# Altium footprint library Connector_Samtec_HLE_SMD.PcbLib: 290 footprints (part 14 of 24)
Each footprint in its own frame and in the unit in brackets; x right, y up, seen from the top. Pads: shape width x height; smd on the part's side, far side on the other; paste and mask are expansions set on the pad; w line width, h text height; cw(c..) or ccw(c..) is an arc to the next point about the centre after c.
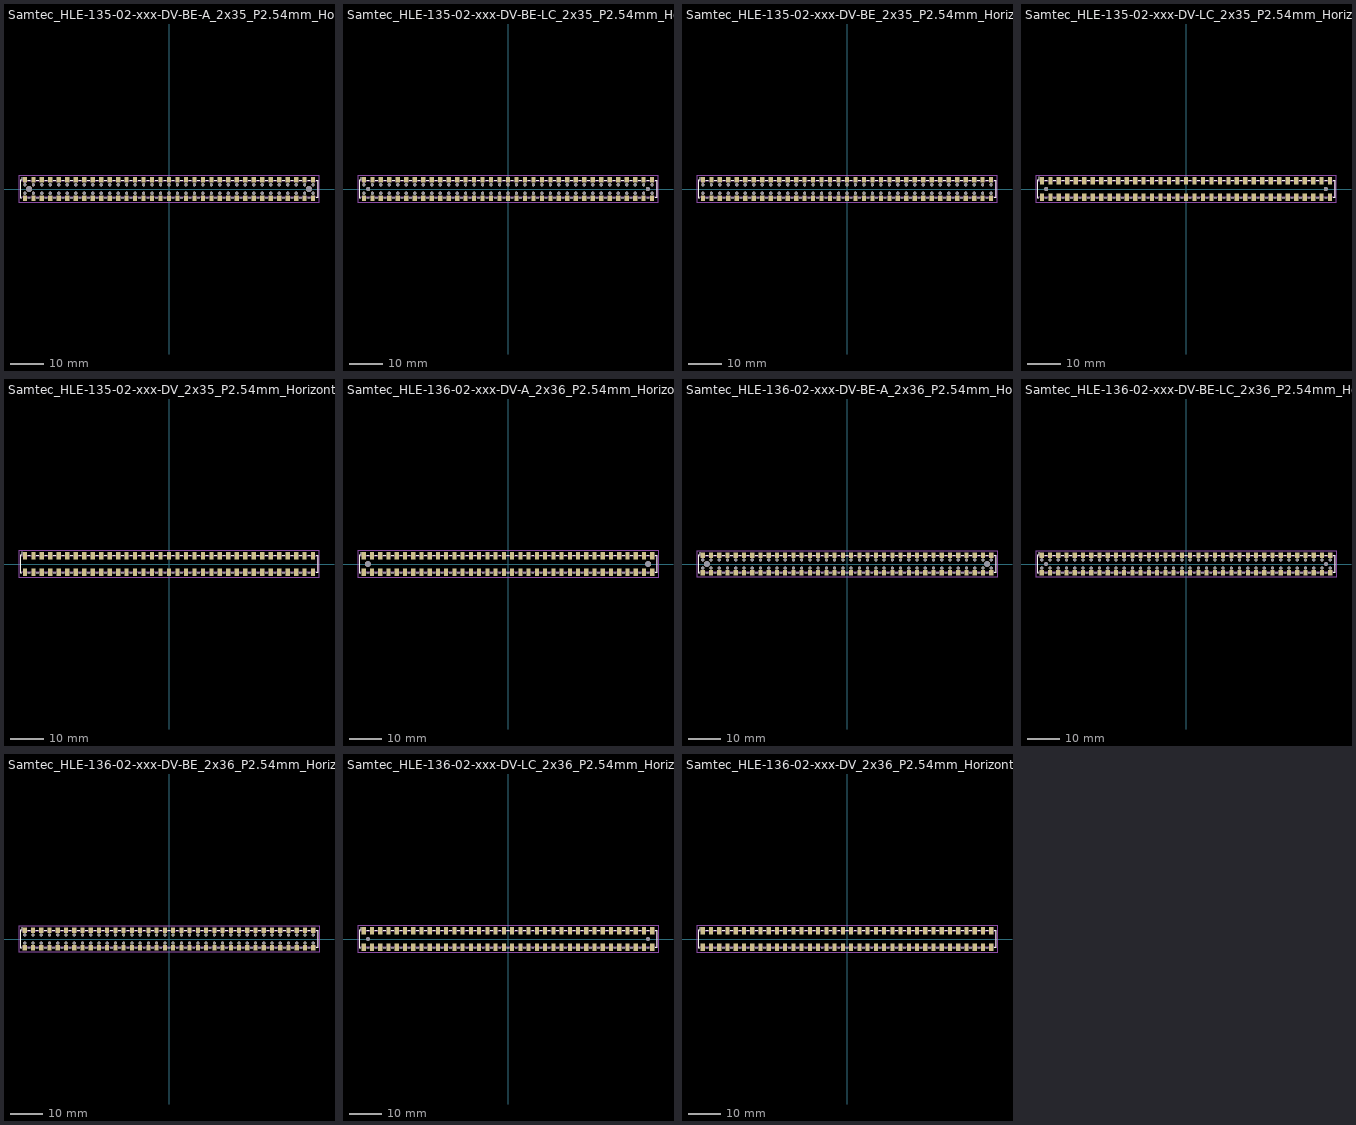
[diagram p13: the footprints below, top view; thin cyan lines are the x and y axes]

## Samtec_HLE-135-02-xxx-DV-BE-A_2x35_P2.54mm_Horizontal [mm]
pads (142):
  rect 1.27x1.68 smd: 1(-43.18,2.72) 2(-43.18,-2.72) 3(-40.64,2.72) 4(-40.64,-2.72) 5(-38.1,2.72) 6(-38.1,-2.72) 7(-35.56,2.72) 8(-35.56,-2.72) 9(-33.02,2.72) 10(-33.02,-2.72) 11(-30.48,2.72) 12(-30.48,-2.72) 13(-27.94,2.72) 14(-27.94,-2.72) 15(-25.4,2.72) 16(-25.4,-2.72) 17(-22.86,2.72) 18(-22.86,-2.72) 19(-20.32,2.72) 20(-20.32,-2.72) 21(-17.78,2.72) 22(-17.78,-2.72) 23(-15.24,2.72) 24(-15.24,-2.72) 25(-12.7,2.72) 26(-12.7,-2.72) 27(-10.16,2.72) 28(-10.16,-2.72) 29(-7.62,2.72) 30(-7.62,-2.72) 31(-5.08,2.72) 32(-5.08,-2.72) 33(-2.54,2.72) 34(-2.54,-2.72) 35(0,2.72) 36(0,-2.72) 37(2.54,2.72) 38(2.54,-2.72) 39(5.08,2.72) 40(5.08,-2.72) 41(7.62,2.72) 42(7.62,-2.72) 43(10.16,2.72) 44(10.16,-2.72) 45(12.7,2.72) 46(12.7,-2.72) 47(15.24,2.72) 48(15.24,-2.72) 49(17.78,2.72) 50(17.78,-2.72) 51(20.32,2.72) 52(20.32,-2.72) 53(22.86,2.72) 54(22.86,-2.72) 55(25.4,2.72) 56(25.4,-2.72) 57(27.94,2.72) 58(27.94,-2.72) 59(30.48,2.72) 60(30.48,-2.72) 61(33.02,2.72) 62(33.02,-2.72) 63(35.56,2.72) 64(35.56,-2.72) 65(38.1,2.72) 66(38.1,-2.72) 67(40.64,2.72) 68(40.64,-2.72) 69(43.18,2.72) 70(43.18,-2.72)
  round 0.97 hole 0.97: Un1(5.08,1.27) Un2(-38.1,1.27) Un3(30.48,1.27) Un4(12.7,1.27) Un5(-15.24,-1.27) Un6(0,-1.27) Un7(22.86,-1.27) Un8(-20.32,1.27) Un9(38.1,1.27) Un10(22.86,1.27) Un11(-27.94,-1.27) Un12(-25.4,1.27) Un13(25.4,1.27) Un14(27.94,-1.27) Un15(-17.78,1.27) Un16(-7.62,1.27) Un17(-35.56,-1.27) Un18(20.32,1.27) Un19(-20.32,-1.27) Un20(-40.64,1.27) Un21(-15.24,1.27) Un22(12.7,-1.27) Un24(25.4,-1.27) Un26(-5.08,1.27) Un27(-10.16,-1.27) Un28(-12.7,1.27) Un29(-30.48,1.27) Un30(33.02,-1.27) Un31(10.16,-1.27) Un32(0,1.27) Un33(5.08,-1.27) Un34(-12.7,-1.27) Un35(-33.02,1.27) Un36(-40.64,-1.27) Un37(-43.18,-1.27) Un38(-22.86,1.27) Un39(17.78,-1.27) Un40(35.56,-1.27) Un41(7.62,1.27) Un42(40.64,1.27) Un43(40.64,-1.27) Un44(-7.62,-1.27) Un45(2.54,1.27) Un46(35.56,1.27) Un47(43.18,1.27) Un48(38.1,-1.27) Un49(-5.08,-1.27) Un50(-10.16,1.27) Un51(20.32,-1.27) Un52(-2.54,-1.27) Un53(-38.1,-1.27) Un54(33.02,1.27) Un55(-27.94,1.27) Un56(30.48,-1.27) Un57(43.18,-1.27) Un58(17.78,1.27) Un59(-35.56,1.27) Un60(-25.4,-1.27) Un61(15.24,-1.27) Un62(27.94,1.27) Un63(-2.54,1.27) Un64(15.24,1.27) Un65(7.62,-1.27) Un66(-43.18,1.27) Un67(-33.02,-1.27) Un68(-22.86,-1.27) Un69(-17.78,-1.27) Un70(2.54,-1.27) Un71(10.16,1.27) Un72(-30.48,-1.27)
  round 1.78 hole 1.78: Un23(-41.91,0) Un25(41.91,0)
F.SilkS:
  lines w0.12: -44.075,-2.65 -44.56,-2.65 -44.56,2.65 -44.075,2.65 -44.075,3.56 ; -42.285,-2.65 -41.535,-2.65 ; -42.285,2.65 -41.535,2.65 ; -39.745,-2.65 -38.995,-2.65 ; -39.745,2.65 -38.995,2.65 ; -37.205,-2.65 -36.455,-2.65 ; -37.205,2.65 -36.455,2.65 ; -34.665,-2.65 -33.915,-2.65 ; -34.665,2.65 -33.915,2.65 ; -32.125,-2.65 -31.375,-2.65 ; -32.125,2.65 -31.375,2.65 ; -29.585,-2.65 -28.835,-2.65 ; -29.585,2.65 -28.835,2.65 ; -27.045,-2.65 -26.295,-2.65 ; -27.045,2.65 -26.295,2.65 ; -24.505,-2.65 -23.755,-2.65 ; -24.505,2.65 -23.755,2.65 ; -21.965,-2.65 -21.215,-2.65 ; -21.965,2.65 -21.215,2.65 ; -19.425,-2.65 -18.675,-2.65 ; -19.425,2.65 -18.675,2.65 ; -16.885,-2.65 -16.135,-2.65 ; -16.885,2.65 -16.135,2.65 ; -14.345,-2.65 -13.595,-2.65 ; -14.345,2.65 -13.595,2.65 ; -11.805,-2.65 -11.055,-2.65 ; -11.805,2.65 -11.055,2.65 ; -9.265,-2.65 -8.515,-2.65 ; -9.265,2.65 -8.515,2.65 ; -6.725,-2.65 -5.975,-2.65 ; -6.725,2.65 -5.975,2.65 ; -4.185,-2.65 -3.435,-2.65 ; -4.185,2.65 -3.435,2.65 ; -1.645,-2.65 -0.895,-2.65 ; -1.645,2.65 -0.895,2.65 ; 0.895,-2.65 1.645,-2.65 ; 0.895,2.65 1.645,2.65 ; 3.435,-2.65 4.185,-2.65 ; 3.435,2.65 4.185,2.65 ; 5.975,-2.65 6.725,-2.65 ; 5.975,2.65 6.725,2.65 ; 8.515,-2.65 9.265,-2.65 ; 8.515,2.65 9.265,2.65 ; 11.055,-2.65 11.805,-2.65 ; 11.055,2.65 11.805,2.65 ; 13.595,-2.65 14.345,-2.65 ; 13.595,2.65 14.345,2.65 ; 16.135,-2.65 16.885,-2.65 ; 16.135,2.65 16.885,2.65 ; 18.675,-2.65 19.425,-2.65 ; 18.675,2.65 19.425,2.65 ; 21.215,-2.65 21.965,-2.65 ; 21.215,2.65 21.965,2.65 ; 23.755,-2.65 24.505,-2.65 ; 23.755,2.65 24.505,2.65 ; 26.295,-2.65 27.045,-2.65 ; 26.295,2.65 27.045,2.65 ; 28.835,-2.65 29.585,-2.65 ; 28.835,2.65 29.585,2.65 ; 31.375,-2.65 32.125,-2.65 ; 31.375,2.65 32.125,2.65 ; 33.915,-2.65 34.665,-2.65 ; 33.915,2.65 34.665,2.65 ; 36.455,-2.65 37.205,-2.65 ; 36.455,2.65 37.205,2.65 ; 38.995,-2.65 39.745,-2.65 ; 38.995,2.65 39.745,2.65 ; 41.535,-2.65 42.285,-2.65 ; 41.535,2.65 42.285,2.65 ; 44.075,-2.65 44.56,-2.65 44.56,2.65 44.075,2.65
F.CrtYd:
  lines w0.05: -44.95,-4.06 44.95,-4.06 44.95,4.06 -44.95,4.06 -44.95,-4.06
F.Fab:
  lines w0.1: -43.68,2.54 -43.18,1.833 -42.68,2.54 ; -44.45,-2.54 -44.45,2.54 44.45,2.54 44.45,-2.54 -44.45,-2.54
  text "'.Designator'" at -4.047,-2.68 h1

## Samtec_HLE-135-02-xxx-DV-BE-LC_2x35_P2.54mm_Horizontal [mm]
pads (142):
  rect 1.27x1.68 smd: 1(-43.18,2.72) 2(-43.18,-2.72) 3(-40.64,2.72) 4(-40.64,-2.72) 5(-38.1,2.72) 6(-38.1,-2.72) 7(-35.56,2.72) 8(-35.56,-2.72) 9(-33.02,2.72) 10(-33.02,-2.72) 11(-30.48,2.72) 12(-30.48,-2.72) 13(-27.94,2.72) 14(-27.94,-2.72) 15(-25.4,2.72) 16(-25.4,-2.72) 17(-22.86,2.72) 18(-22.86,-2.72) 19(-20.32,2.72) 20(-20.32,-2.72) 21(-17.78,2.72) 22(-17.78,-2.72) 23(-15.24,2.72) 24(-15.24,-2.72) 25(-12.7,2.72) 26(-12.7,-2.72) 27(-10.16,2.72) 28(-10.16,-2.72) 29(-7.62,2.72) 30(-7.62,-2.72) 31(-5.08,2.72) 32(-5.08,-2.72) 33(-2.54,2.72) 34(-2.54,-2.72) 35(0,2.72) 36(0,-2.72) 37(2.54,2.72) 38(2.54,-2.72) 39(5.08,2.72) 40(5.08,-2.72) 41(7.62,2.72) 42(7.62,-2.72) 43(10.16,2.72) 44(10.16,-2.72) 45(12.7,2.72) 46(12.7,-2.72) 47(15.24,2.72) 48(15.24,-2.72) 49(17.78,2.72) 50(17.78,-2.72) 51(20.32,2.72) 52(20.32,-2.72) 53(22.86,2.72) 54(22.86,-2.72) 55(25.4,2.72) 56(25.4,-2.72) 57(27.94,2.72) 58(27.94,-2.72) 59(30.48,2.72) 60(30.48,-2.72) 61(33.02,2.72) 62(33.02,-2.72) 63(35.56,2.72) 64(35.56,-2.72) 65(38.1,2.72) 66(38.1,-2.72) 67(40.64,2.72) 68(40.64,-2.72) 69(43.18,2.72) 70(43.18,-2.72)
  round 0.97 hole 0.97: Un1(17.78,-1.27) Un2(-25.4,1.27) Un3(-2.54,-1.27) Un4(33.02,-1.27) Un5(-10.16,1.27) Un6(-7.62,1.27) Un7(-5.08,-1.27) Un8(27.94,-1.27) Un9(2.54,1.27) Un10(40.64,-1.27) Un11(-15.24,1.27) Un12(-10.16,-1.27) Un13(35.56,1.27) Un14(5.08,-1.27) Un16(-30.48,-1.27) Un17(0,1.27) Un18(-35.56,1.27) Un19(-27.94,-1.27) Un20(22.86,1.27) Un21(-12.7,-1.27) Un22(30.48,-1.27) Un23(25.4,1.27) Un24(-38.1,-1.27) Un25(38.1,-1.27) Un26(-33.02,-1.27) Un27(-17.78,-1.27) Un28(43.18,1.27) Un29(-33.02,1.27) Un30(-20.32,-1.27) Un31(15.24,1.27) Un32(-2.54,1.27) Un33(10.16,1.27) Un34(-20.32,1.27) Un35(-7.62,-1.27) Un36(17.78,1.27) Un37(40.64,1.27) Un38(-22.86,1.27) Un39(43.18,-1.27) Un40(33.02,1.27) Un41(-35.56,-1.27) Un42(-22.86,-1.27) Un43(-30.48,1.27) Un44(-17.78,1.27) Un45(-27.94,1.27) Un46(-40.64,1.27) Un47(12.7,1.27) Un48(-43.18,1.27) Un49(-38.1,1.27) Un50(-12.7,1.27) Un51(7.62,-1.27) Un52(20.32,-1.27) Un53(30.48,1.27) Un54(12.7,-1.27) Un56(15.24,-1.27) Un57(-5.08,1.27) Un58(-25.4,-1.27) Un59(2.54,-1.27) Un60(10.16,-1.27) Un61(-40.64,-1.27) Un62(38.1,1.27) Un63(35.56,-1.27) Un64(27.94,1.27) Un65(5.08,1.27) Un66(-43.18,-1.27) Un67(-15.24,-1.27) Un68(20.32,1.27) Un69(0,-1.27) Un70(25.4,-1.27) Un71(7.62,1.27) Un72(22.86,-1.27)
  round 1.19 hole 1.19: Un15(41.91,0) Un55(-41.91,0)
F.SilkS:
  lines w0.12: -44.075,-2.65 -44.56,-2.65 -44.56,2.65 -44.075,2.65 -44.075,3.56 ; -42.285,-2.65 -41.535,-2.65 ; -42.285,2.65 -41.535,2.65 ; -39.745,-2.65 -38.995,-2.65 ; -39.745,2.65 -38.995,2.65 ; -37.205,-2.65 -36.455,-2.65 ; -37.205,2.65 -36.455,2.65 ; -34.665,-2.65 -33.915,-2.65 ; -34.665,2.65 -33.915,2.65 ; -32.125,-2.65 -31.375,-2.65 ; -32.125,2.65 -31.375,2.65 ; -29.585,-2.65 -28.835,-2.65 ; -29.585,2.65 -28.835,2.65 ; -27.045,-2.65 -26.295,-2.65 ; -27.045,2.65 -26.295,2.65 ; -24.505,-2.65 -23.755,-2.65 ; -24.505,2.65 -23.755,2.65 ; -21.965,-2.65 -21.215,-2.65 ; -21.965,2.65 -21.215,2.65 ; -19.425,-2.65 -18.675,-2.65 ; -19.425,2.65 -18.675,2.65 ; -16.885,-2.65 -16.135,-2.65 ; -16.885,2.65 -16.135,2.65 ; -14.345,-2.65 -13.595,-2.65 ; -14.345,2.65 -13.595,2.65 ; -11.805,-2.65 -11.055,-2.65 ; -11.805,2.65 -11.055,2.65 ; -9.265,-2.65 -8.515,-2.65 ; -9.265,2.65 -8.515,2.65 ; -6.725,-2.65 -5.975,-2.65 ; -6.725,2.65 -5.975,2.65 ; -4.185,-2.65 -3.435,-2.65 ; -4.185,2.65 -3.435,2.65 ; -1.645,-2.65 -0.895,-2.65 ; -1.645,2.65 -0.895,2.65 ; 0.895,-2.65 1.645,-2.65 ; 0.895,2.65 1.645,2.65 ; 3.435,-2.65 4.185,-2.65 ; 3.435,2.65 4.185,2.65 ; 5.975,-2.65 6.725,-2.65 ; 5.975,2.65 6.725,2.65 ; 8.515,-2.65 9.265,-2.65 ; 8.515,2.65 9.265,2.65 ; 11.055,-2.65 11.805,-2.65 ; 11.055,2.65 11.805,2.65 ; 13.595,-2.65 14.345,-2.65 ; 13.595,2.65 14.345,2.65 ; 16.135,-2.65 16.885,-2.65 ; 16.135,2.65 16.885,2.65 ; 18.675,-2.65 19.425,-2.65 ; 18.675,2.65 19.425,2.65 ; 21.215,-2.65 21.965,-2.65 ; 21.215,2.65 21.965,2.65 ; 23.755,-2.65 24.505,-2.65 ; 23.755,2.65 24.505,2.65 ; 26.295,-2.65 27.045,-2.65 ; 26.295,2.65 27.045,2.65 ; 28.835,-2.65 29.585,-2.65 ; 28.835,2.65 29.585,2.65 ; 31.375,-2.65 32.125,-2.65 ; 31.375,2.65 32.125,2.65 ; 33.915,-2.65 34.665,-2.65 ; 33.915,2.65 34.665,2.65 ; 36.455,-2.65 37.205,-2.65 ; 36.455,2.65 37.205,2.65 ; 38.995,-2.65 39.745,-2.65 ; 38.995,2.65 39.745,2.65 ; 41.535,-2.65 42.285,-2.65 ; 41.535,2.65 42.285,2.65 ; 44.075,-2.65 44.56,-2.65 44.56,2.65 44.075,2.65
F.CrtYd:
  lines w0.05: -44.95,-4.06 -44.95,4.06 44.95,4.06 44.95,-4.06 -44.95,-4.06
F.Fab:
  lines w0.1: -43.68,2.54 -43.18,1.833 -42.68,2.54 ; -44.45,-2.54 -44.45,2.54 44.45,2.54 44.45,-2.54 -44.45,-2.54
  text "'.Designator'" at -4.047,-2.68 h1

## Samtec_HLE-135-02-xxx-DV-BE_2x35_P2.54mm_Horizontal [mm]
pads (140):
  rect 1.27x1.68 smd: 1(-43.18,2.72) 2(-43.18,-2.72) 3(-40.64,2.72) 4(-40.64,-2.72) 5(-38.1,2.72) 6(-38.1,-2.72) 7(-35.56,2.72) 8(-35.56,-2.72) 9(-33.02,2.72) 10(-33.02,-2.72) 11(-30.48,2.72) 12(-30.48,-2.72) 13(-27.94,2.72) 14(-27.94,-2.72) 15(-25.4,2.72) 16(-25.4,-2.72) 17(-22.86,2.72) 18(-22.86,-2.72) 19(-20.32,2.72) 20(-20.32,-2.72) 21(-17.78,2.72) 22(-17.78,-2.72) 23(-15.24,2.72) 24(-15.24,-2.72) 25(-12.7,2.72) 26(-12.7,-2.72) 27(-10.16,2.72) 28(-10.16,-2.72) 29(-7.62,2.72) 30(-7.62,-2.72) 31(-5.08,2.72) 32(-5.08,-2.72) 33(-2.54,2.72) 34(-2.54,-2.72) 35(0,2.72) 36(0,-2.72) 37(2.54,2.72) 38(2.54,-2.72) 39(5.08,2.72) 40(5.08,-2.72) 41(7.62,2.72) 42(7.62,-2.72) 43(10.16,2.72) 44(10.16,-2.72) 45(12.7,2.72) 46(12.7,-2.72) 47(15.24,2.72) 48(15.24,-2.72) 49(17.78,2.72) 50(17.78,-2.72) 51(20.32,2.72) 52(20.32,-2.72) 53(22.86,2.72) 54(22.86,-2.72) 55(25.4,2.72) 56(25.4,-2.72) 57(27.94,2.72) 58(27.94,-2.72) 59(30.48,2.72) 60(30.48,-2.72) 61(33.02,2.72) 62(33.02,-2.72) 63(35.56,2.72) 64(35.56,-2.72) 65(38.1,2.72) 66(38.1,-2.72) 67(40.64,2.72) 68(40.64,-2.72) 69(43.18,2.72) 70(43.18,-2.72)
  round 0.97 hole 0.97: Un1(33.02,-1.27) Un2(5.08,-1.27) Un3(-40.64,1.27) Un4(17.78,-1.27) Un5(22.86,1.27) Un6(-27.94,1.27) Un7(-5.08,-1.27) Un8(7.62,1.27) Un9(30.48,1.27) Un10(-35.56,-1.27) Un11(22.86,-1.27) Un12(7.62,-1.27) Un13(-17.78,1.27) Un14(-33.02,-1.27) Un15(20.32,1.27) Un16(-22.86,-1.27) Un17(-30.48,1.27) Un18(15.24,1.27) Un19(0,1.27) Un20(-38.1,-1.27) Un21(-12.7,-1.27) Un22(-38.1,1.27) Un23(20.32,-1.27) Un24(-10.16,1.27) Un25(25.4,1.27) Un26(2.54,1.27) Un27(25.4,-1.27) Un28(-15.24,1.27) Un29(40.64,-1.27) Un30(-20.32,-1.27) Un31(-10.16,-1.27) Un32(10.16,-1.27) Un33(-25.4,1.27) Un34(-40.64,-1.27) Un35(-7.62,-1.27) Un36(-27.94,-1.27) Un37(38.1,-1.27) Un38(-2.54,-1.27) Un39(30.48,-1.27) Un40(5.08,1.27) Un41(15.24,-1.27) Un42(27.94,-1.27) Un43(-22.86,1.27) Un44(27.94,1.27) Un45(-43.18,1.27) Un46(-12.7,1.27) Un47(-15.24,-1.27) Un48(43.18,1.27) Un49(12.7,-1.27) Un50(33.02,1.27) Un51(-5.08,1.27) Un52(38.1,1.27) Un53(35.56,1.27) Un54(12.7,1.27) Un55(-33.02,1.27) Un56(35.56,-1.27) Un57(2.54,-1.27) Un58(17.78,1.27) Un59(-7.62,1.27) Un60(-25.4,-1.27) Un61(10.16,1.27) Un62(43.18,-1.27) Un63(-2.54,1.27) Un64(40.64,1.27) Un65(-43.18,-1.27) Un66(-17.78,-1.27) Un67(0,-1.27) Un68(-35.56,1.27) Un69(-30.48,-1.27) Un70(-20.32,1.27)
F.SilkS:
  lines w0.12: -44.075,-2.65 -44.56,-2.65 -44.56,2.65 -44.075,2.65 -44.075,3.56 ; -42.285,-2.65 -41.535,-2.65 ; -42.285,2.65 -41.535,2.65 ; -39.745,-2.65 -38.995,-2.65 ; -39.745,2.65 -38.995,2.65 ; -37.205,-2.65 -36.455,-2.65 ; -37.205,2.65 -36.455,2.65 ; -34.665,-2.65 -33.915,-2.65 ; -34.665,2.65 -33.915,2.65 ; -32.125,-2.65 -31.375,-2.65 ; -32.125,2.65 -31.375,2.65 ; -29.585,-2.65 -28.835,-2.65 ; -29.585,2.65 -28.835,2.65 ; -27.045,-2.65 -26.295,-2.65 ; -27.045,2.65 -26.295,2.65 ; -24.505,-2.65 -23.755,-2.65 ; -24.505,2.65 -23.755,2.65 ; -21.965,-2.65 -21.215,-2.65 ; -21.965,2.65 -21.215,2.65 ; -19.425,-2.65 -18.675,-2.65 ; -19.425,2.65 -18.675,2.65 ; -16.885,-2.65 -16.135,-2.65 ; -16.885,2.65 -16.135,2.65 ; -14.345,-2.65 -13.595,-2.65 ; -14.345,2.65 -13.595,2.65 ; -11.805,-2.65 -11.055,-2.65 ; -11.805,2.65 -11.055,2.65 ; -9.265,-2.65 -8.515,-2.65 ; -9.265,2.65 -8.515,2.65 ; -6.725,-2.65 -5.975,-2.65 ; -6.725,2.65 -5.975,2.65 ; -4.185,-2.65 -3.435,-2.65 ; -4.185,2.65 -3.435,2.65 ; -1.645,-2.65 -0.895,-2.65 ; -1.645,2.65 -0.895,2.65 ; 0.895,-2.65 1.645,-2.65 ; 0.895,2.65 1.645,2.65 ; 3.435,-2.65 4.185,-2.65 ; 3.435,2.65 4.185,2.65 ; 5.975,-2.65 6.725,-2.65 ; 5.975,2.65 6.725,2.65 ; 8.515,-2.65 9.265,-2.65 ; 8.515,2.65 9.265,2.65 ; 11.055,-2.65 11.805,-2.65 ; 11.055,2.65 11.805,2.65 ; 13.595,-2.65 14.345,-2.65 ; 13.595,2.65 14.345,2.65 ; 16.135,-2.65 16.885,-2.65 ; 16.135,2.65 16.885,2.65 ; 18.675,-2.65 19.425,-2.65 ; 18.675,2.65 19.425,2.65 ; 21.215,-2.65 21.965,-2.65 ; 21.215,2.65 21.965,2.65 ; 23.755,-2.65 24.505,-2.65 ; 23.755,2.65 24.505,2.65 ; 26.295,-2.65 27.045,-2.65 ; 26.295,2.65 27.045,2.65 ; 28.835,-2.65 29.585,-2.65 ; 28.835,2.65 29.585,2.65 ; 31.375,-2.65 32.125,-2.65 ; 31.375,2.65 32.125,2.65 ; 33.915,-2.65 34.665,-2.65 ; 33.915,2.65 34.665,2.65 ; 36.455,-2.65 37.205,-2.65 ; 36.455,2.65 37.205,2.65 ; 38.995,-2.65 39.745,-2.65 ; 38.995,2.65 39.745,2.65 ; 41.535,-2.65 42.285,-2.65 ; 41.535,2.65 42.285,2.65 ; 44.075,-2.65 44.56,-2.65 44.56,2.65 44.075,2.65
F.CrtYd:
  lines w0.05: -44.95,-4.06 44.95,-4.06 44.95,4.06 -44.95,4.06 -44.95,-4.06
F.Fab:
  lines w0.1: -43.68,2.54 -43.18,1.833 -42.68,2.54 ; -44.45,-2.54 44.45,-2.54 44.45,2.54 -44.45,2.54 -44.45,-2.54
  text "'.Designator'" at -4.047,-2.68 h1

## Samtec_HLE-135-02-xxx-DV-LC_2x35_P2.54mm_Horizontal [mm]
pads (72):
  rect 1.27x2.29 smd: 1(-43.18,2.525) 2(-43.18,-2.525) 3(-40.64,2.525) 4(-40.64,-2.525) 5(-38.1,2.525) 6(-38.1,-2.525) 7(-35.56,2.525) 8(-35.56,-2.525) 9(-33.02,2.525) 10(-33.02,-2.525) 11(-30.48,2.525) 12(-30.48,-2.525) 13(-27.94,2.525) 14(-27.94,-2.525) 15(-25.4,2.525) 16(-25.4,-2.525) 17(-22.86,2.525) 18(-22.86,-2.525) 19(-20.32,2.525) 20(-20.32,-2.525) 21(-17.78,2.525) 22(-17.78,-2.525) 23(-15.24,2.525) 24(-15.24,-2.525) 25(-12.7,2.525) 26(-12.7,-2.525) 27(-10.16,2.525) 28(-10.16,-2.525) 29(-7.62,2.525) 30(-7.62,-2.525) 31(-5.08,2.525) 32(-5.08,-2.525) 33(-2.54,2.525) 34(-2.54,-2.525) 35(0,2.525) 36(0,-2.525) 37(2.54,2.525) 38(2.54,-2.525) 39(5.08,2.525) 40(5.08,-2.525) 41(7.62,2.525) 42(7.62,-2.525) 43(10.16,2.525) 44(10.16,-2.525) 45(12.7,2.525) 46(12.7,-2.525) 47(15.24,2.525) 48(15.24,-2.525) 49(17.78,2.525) 50(17.78,-2.525) 51(20.32,2.525) 52(20.32,-2.525) 53(22.86,2.525) 54(22.86,-2.525) 55(25.4,2.525) 56(25.4,-2.525) 57(27.94,2.525) 58(27.94,-2.525) 59(30.48,2.525) 60(30.48,-2.525) 61(33.02,2.525) 62(33.02,-2.525) 63(35.56,2.525) 64(35.56,-2.525) 65(38.1,2.525) 66(38.1,-2.525) 67(40.64,2.525) 68(40.64,-2.525) 69(43.18,2.525) 70(43.18,-2.525)
  round 1.19 hole 1.19: Un1(-41.91,0) Un2(41.91,0)
F.SilkS:
  lines w0.12: -44.075,-2.65 -44.56,-2.65 -44.56,2.65 -44.075,2.65 -44.075,3.67 ; -42.285,-2.65 -41.535,-2.65 ; -42.285,2.65 -41.535,2.65 ; -39.745,-2.65 -38.995,-2.65 ; -39.745,2.65 -38.995,2.65 ; -37.205,-2.65 -36.455,-2.65 ; -37.205,2.65 -36.455,2.65 ; -34.665,-2.65 -33.915,-2.65 ; -34.665,2.65 -33.915,2.65 ; -32.125,-2.65 -31.375,-2.65 ; -32.125,2.65 -31.375,2.65 ; -29.585,-2.65 -28.835,-2.65 ; -29.585,2.65 -28.835,2.65 ; -27.045,-2.65 -26.295,-2.65 ; -27.045,2.65 -26.295,2.65 ; -24.505,-2.65 -23.755,-2.65 ; -24.505,2.65 -23.755,2.65 ; -21.965,-2.65 -21.215,-2.65 ; -21.965,2.65 -21.215,2.65 ; -19.425,-2.65 -18.675,-2.65 ; -19.425,2.65 -18.675,2.65 ; -16.885,-2.65 -16.135,-2.65 ; -16.885,2.65 -16.135,2.65 ; -14.345,-2.65 -13.595,-2.65 ; -14.345,2.65 -13.595,2.65 ; -11.805,-2.65 -11.055,-2.65 ; -11.805,2.65 -11.055,2.65 ; -9.265,-2.65 -8.515,-2.65 ; -9.265,2.65 -8.515,2.65 ; -6.725,-2.65 -5.975,-2.65 ; -6.725,2.65 -5.975,2.65 ; -4.185,-2.65 -3.435,-2.65 ; -4.185,2.65 -3.435,2.65 ; -1.645,-2.65 -0.895,-2.65 ; -1.645,2.65 -0.895,2.65 ; 0.895,-2.65 1.645,-2.65 ; 0.895,2.65 1.645,2.65 ; 3.435,-2.65 4.185,-2.65 ; 3.435,2.65 4.185,2.65 ; 5.975,-2.65 6.725,-2.65 ; 5.975,2.65 6.725,2.65 ; 8.515,-2.65 9.265,-2.65 ; 8.515,2.65 9.265,2.65 ; 11.055,-2.65 11.805,-2.65 ; 11.055,2.65 11.805,2.65 ; 13.595,-2.65 14.345,-2.65 ; 13.595,2.65 14.345,2.65 ; 16.135,-2.65 16.885,-2.65 ; 16.135,2.65 16.885,2.65 ; 18.675,-2.65 19.425,-2.65 ; 18.675,2.65 19.425,2.65 ; 21.215,-2.65 21.965,-2.65 ; 21.215,2.65 21.965,2.65 ; 23.755,-2.65 24.505,-2.65 ; 23.755,2.65 24.505,2.65 ; 26.295,-2.65 27.045,-2.65 ; 26.295,2.65 27.045,2.65 ; 28.835,-2.65 29.585,-2.65 ; 28.835,2.65 29.585,2.65 ; 31.375,-2.65 32.125,-2.65 ; 31.375,2.65 32.125,2.65 ; 33.915,-2.65 34.665,-2.65 ; 33.915,2.65 34.665,2.65 ; 36.455,-2.65 37.205,-2.65 ; 36.455,2.65 37.205,2.65 ; 38.995,-2.65 39.745,-2.65 ; 38.995,2.65 39.745,2.65 ; 41.535,-2.65 42.285,-2.65 ; 41.535,2.65 42.285,2.65 ; 44.075,-2.65 44.56,-2.65 44.56,2.65 44.075,2.65
F.CrtYd:
  lines w0.05: -44.95,-4.17 -44.95,4.17 44.95,4.17 44.95,-4.17 -44.95,-4.17
F.Fab:
  lines w0.1: -43.68,2.54 -43.18,1.833 -42.68,2.54 ; -44.45,-2.54 -44.45,2.54 44.45,2.54 44.45,-2.54 -44.45,-2.54
  text "'.Designator'" at -4.047,-2.68 h1

## Samtec_HLE-135-02-xxx-DV_2x35_P2.54mm_Horizontal [mm]
pads (70):
  rect 1.27x2.29 smd: 1(-43.18,2.525) 2(-43.18,-2.525) 3(-40.64,2.525) 4(-40.64,-2.525) 5(-38.1,2.525) 6(-38.1,-2.525) 7(-35.56,2.525) 8(-35.56,-2.525) 9(-33.02,2.525) 10(-33.02,-2.525) 11(-30.48,2.525) 12(-30.48,-2.525) 13(-27.94,2.525) 14(-27.94,-2.525) 15(-25.4,2.525) 16(-25.4,-2.525) 17(-22.86,2.525) 18(-22.86,-2.525) 19(-20.32,2.525) 20(-20.32,-2.525) 21(-17.78,2.525) 22(-17.78,-2.525) 23(-15.24,2.525) 24(-15.24,-2.525) 25(-12.7,2.525) 26(-12.7,-2.525) 27(-10.16,2.525) 28(-10.16,-2.525) 29(-7.62,2.525) 30(-7.62,-2.525) 31(-5.08,2.525) 32(-5.08,-2.525) 33(-2.54,2.525) 34(-2.54,-2.525) 35(0,2.525) 36(0,-2.525) 37(2.54,2.525) 38(2.54,-2.525) 39(5.08,2.525) 40(5.08,-2.525) 41(7.62,2.525) 42(7.62,-2.525) 43(10.16,2.525) 44(10.16,-2.525) 45(12.7,2.525) 46(12.7,-2.525) 47(15.24,2.525) 48(15.24,-2.525) 49(17.78,2.525) 50(17.78,-2.525) 51(20.32,2.525) 52(20.32,-2.525) 53(22.86,2.525) 54(22.86,-2.525) 55(25.4,2.525) 56(25.4,-2.525) 57(27.94,2.525) 58(27.94,-2.525) 59(30.48,2.525) 60(30.48,-2.525) 61(33.02,2.525) 62(33.02,-2.525) 63(35.56,2.525) 64(35.56,-2.525) 65(38.1,2.525) 66(38.1,-2.525) 67(40.64,2.525) 68(40.64,-2.525) 69(43.18,2.525) 70(43.18,-2.525)
F.SilkS:
  lines w0.12: -44.075,-2.65 -44.56,-2.65 -44.56,2.65 -44.075,2.65 -44.075,3.67 ; -42.285,-2.65 -41.535,-2.65 ; -42.285,2.65 -41.535,2.65 ; -39.745,-2.65 -38.995,-2.65 ; -39.745,2.65 -38.995,2.65 ; -37.205,-2.65 -36.455,-2.65 ; -37.205,2.65 -36.455,2.65 ; -34.665,-2.65 -33.915,-2.65 ; -34.665,2.65 -33.915,2.65 ; -32.125,-2.65 -31.375,-2.65 ; -32.125,2.65 -31.375,2.65 ; -29.585,-2.65 -28.835,-2.65 ; -29.585,2.65 -28.835,2.65 ; -27.045,-2.65 -26.295,-2.65 ; -27.045,2.65 -26.295,2.65 ; -24.505,-2.65 -23.755,-2.65 ; -24.505,2.65 -23.755,2.65 ; -21.965,-2.65 -21.215,-2.65 ; -21.965,2.65 -21.215,2.65 ; -19.425,-2.65 -18.675,-2.65 ; -19.425,2.65 -18.675,2.65 ; -16.885,-2.65 -16.135,-2.65 ; -16.885,2.65 -16.135,2.65 ; -14.345,-2.65 -13.595,-2.65 ; -14.345,2.65 -13.595,2.65 ; -11.805,-2.65 -11.055,-2.65 ; -11.805,2.65 -11.055,2.65 ; -9.265,-2.65 -8.515,-2.65 ; -9.265,2.65 -8.515,2.65 ; -6.725,-2.65 -5.975,-2.65 ; -6.725,2.65 -5.975,2.65 ; -4.185,-2.65 -3.435,-2.65 ; -4.185,2.65 -3.435,2.65 ; -1.645,-2.65 -0.895,-2.65 ; -1.645,2.65 -0.895,2.65 ; 0.895,-2.65 1.645,-2.65 ; 0.895,2.65 1.645,2.65 ; 3.435,-2.65 4.185,-2.65 ; 3.435,2.65 4.185,2.65 ; 5.975,-2.65 6.725,-2.65 ; 5.975,2.65 6.725,2.65 ; 8.515,-2.65 9.265,-2.65 ; 8.515,2.65 9.265,2.65 ; 11.055,-2.65 11.805,-2.65 ; 11.055,2.65 11.805,2.65 ; 13.595,-2.65 14.345,-2.65 ; 13.595,2.65 14.345,2.65 ; 16.135,-2.65 16.885,-2.65 ; 16.135,2.65 16.885,2.65 ; 18.675,-2.65 19.425,-2.65 ; 18.675,2.65 19.425,2.65 ; 21.215,-2.65 21.965,-2.65 ; 21.215,2.65 21.965,2.65 ; 23.755,-2.65 24.505,-2.65 ; 23.755,2.65 24.505,2.65 ; 26.295,-2.65 27.045,-2.65 ; 26.295,2.65 27.045,2.65 ; 28.835,-2.65 29.585,-2.65 ; 28.835,2.65 29.585,2.65 ; 31.375,-2.65 32.125,-2.65 ; 31.375,2.65 32.125,2.65 ; 33.915,-2.65 34.665,-2.65 ; 33.915,2.65 34.665,2.65 ; 36.455,-2.65 37.205,-2.65 ; 36.455,2.65 37.205,2.65 ; 38.995,-2.65 39.745,-2.65 ; 38.995,2.65 39.745,2.65 ; 41.535,-2.65 42.285,-2.65 ; 41.535,2.65 42.285,2.65 ; 44.075,-2.65 44.56,-2.65 44.56,2.65 44.075,2.65
F.CrtYd:
  lines w0.05: -44.95,-4.17 -44.95,4.17 44.95,4.17 44.95,-4.17 -44.95,-4.17
F.Fab:
  lines w0.1: -43.68,2.54 -43.18,1.833 -42.68,2.54 ; -44.45,-2.54 -44.45,2.54 44.45,2.54 44.45,-2.54 -44.45,-2.54
  text "'.Designator'" at -4.047,-2.68 h1
